# Altium schematic symbol library GyokuRe.SchLib: 1131 symbols (part 6 of 8)
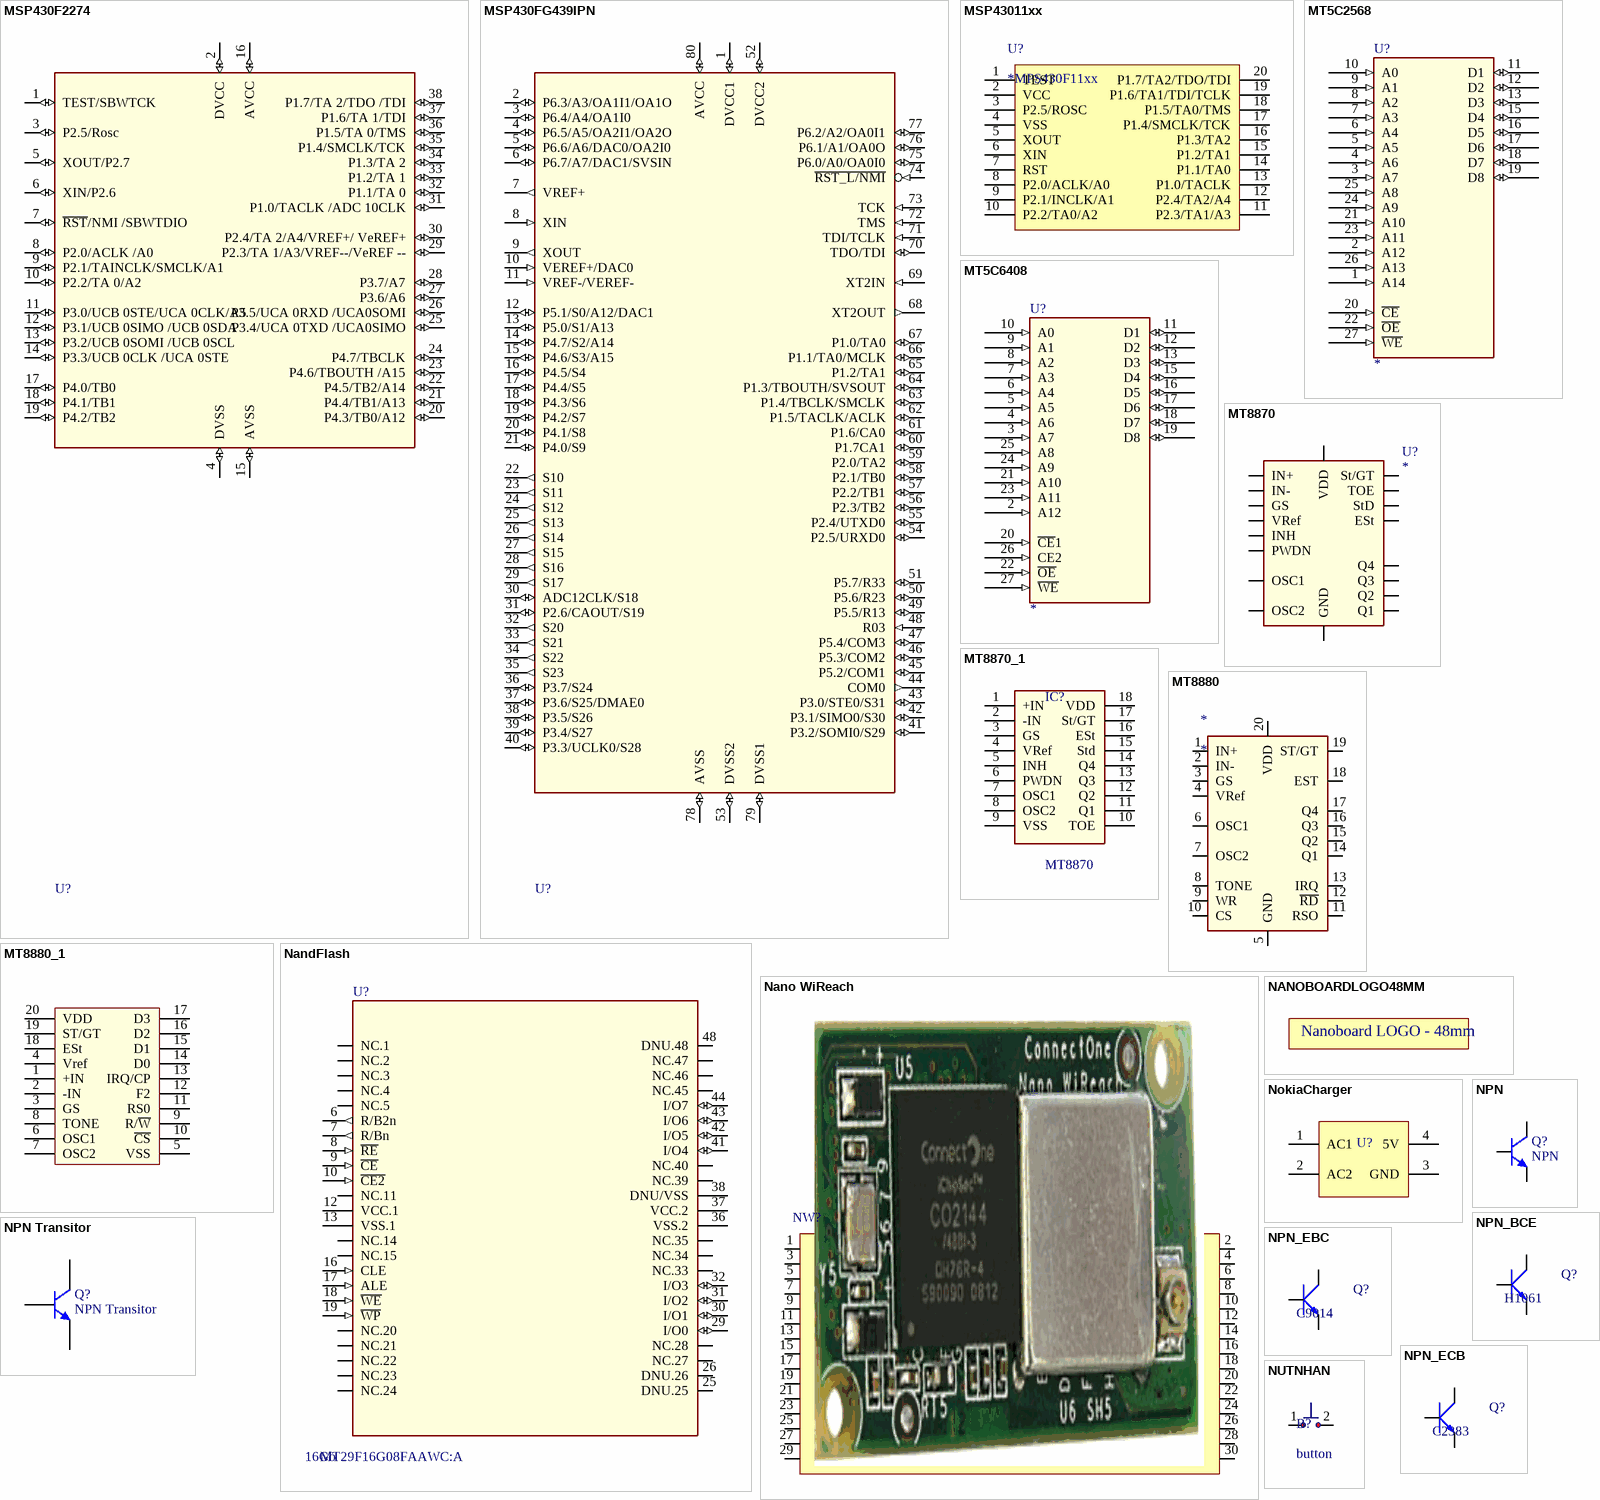
[diagram p54: symbols MSP430F2274 to NUTNHAN]

## MSP430FG439IPN
designator U?
16-bit MCU MSP430 family Texas Instrument; Flash: Kb; SRAM: Bytes; Volt: V; CPU Speed (MIPS): 0 MIPS; ComponentLink1Description: Degikey Part link; ComponentLink1URL: http://search.digikey.com/scripts/DkSearch/dksus.dll?Detail&name=296-17013-ND; ComponentLink2Description: Open DataSheet; ComponentLink2URL: H:\LIBRARY\LIBRARY.Datasheet\msp430fg437.pdf; Publisher: Hoang Nguyen; Manufacturer: Texas Instrument; Price: 13.24 [USD]
footprint QUAD80.MSP430FG439 (80-Pin Thin Quad Flat Pack 0.5 mm Pitch, IPC Low Density)
pins: 1 DVCC1 (io), 2 P6.3/A3/OA1I1/OA1O (io), 3 P6.4/A4/OA1I0 (io), 4 P6.5/A5/OA2I1/OA2O (io), 5 P6.6/A6/DAC0/OA2I0 (io), 6 P6.7/A7/DAC1/SVSIN (io), 7 VREF+ (out), 8 XIN (in), 9 XOUT (out), 10 VEREF+/DAC0 (in), 11 VREF-/VEREF- (in), 12 P5.1/S0/A12/DAC1 (io), 13 P5.0/S1/A13 (io), 14 P4.7/S2/A14 (io), 15 P4.6/S3/A15 (io), 16 P4.5/S4 (io), 17 P4.4/S5 (io), 18 P4.3/S6 (io), 19 P4.2/S7 (io), 20 P4.1/S8 (io), 21 P4.0/S9 (io), 22 S10 (out), 23 S11 (out), 24 S12 (out), 25 S13 (out), 26 S14 (out), 27 S15 (out), 28 S16 (out), 29 S17 (out), 30 ADC12CLK/S18 (io), 31 P2.6/CAOUT/S19 (io), 32 S20 (out), 33 S21 (out), 34 S22 (out), 35 S23 (out), 36 P3.7/S24 (io), 37 P3.6/S25/DMAE0 (io), 38 P3.5/S26 (io), 39 P3.4/S27 (io), 40 P3.3/UCLK0/S28 (io), 41 P3.2/SOMI0/S29 (io), 42 P3.1/SIMO0/S30 (io), 43 P3.0/STE0/S31 (io), 44 COM0 (out), 45 P5.2/COM1 (io), 46 P5.3/COM2 (io), 47 P5.4/COM3 (io), 48 R03 (in), 49 P5.5/R13 (io), 50 P5.6/R23 (io), 51 P5.7/R33 (io), 52 DVCC2 (io), 53 DVSS2 (io), 54 P2.5/URXD0 (io), 55 P2.4/UTXD0 (io), 56 P2.3/TB2 (io), 57 P2.2/TB1 (io), 58 P2.1/TB0 (io), 59 P2.0/TA2 (io), 60 P1.7CA1 (io), 61 P1.6/CA0 (io), 62 P1.5/TACLK/ACLK (io), 63 P1.4/TBCLK/SMCLK (io), 64 P1.3/TBOUTH/SVSOUT (io), 65 P1.2/TA1 (io), 66 P1.1/TA0/MCLK (io), 67 P1.0/TA0 (io), 68 XT2OUT (out), 69 XT2IN (in), 70 TDO/TDI (io), 71 TDI/TCLK (in), 72 TMS (in), 73 TCK (in), 74 ~{RST_L/NMI} (in), 75 P6.0/A0/OA0I0 (io), 76 P6.1/A1/OA0O (io), 77 P6.2/A2/OA0I1 (io), 78 AVSS (io), 79 DVSS1 (io), 80 AVCC (io)

## MSP43011xx
designator U?, comment *MPS430F11xx
pins: 1 TEST, 2 VCC, 3 P2.5/ROSC, 4 VSS, 5 XOUT, 6 XIN, 7 RST, 8 P2.0/ACLK/A0, 9 P2.1/INCLK/A1, 10 P2.2/TA0/A2, 11 P2.3/TA1/A3, 12 P2.4/TA2/A4, 13 P1.0/TACLK, 14 P1.1/TA0, 15 P1.2/TA1, 16 P1.3/TA2, 17 P1.4/SMCLK/TCK, 18 P1.5/TA0/TMS, 19 P1.6/TA1/TDI/TCLK, 20 P1.7/TA2/TDO/TDI

## MT5C2568
designator U?
Vendor: Digikey; Published: 13-April-2009; Publisher: Hoang Nguyen; ComponentLink1Description: Digikey Part Link; ComponentLink2Description: Open Datasheet; ComponentLink2URL: H:\LIBRARY\LIBRARY.Datasheet\
pins: 1 A14 (in), 2 A12 (in), 3 A7 (in), 4 A6 (in), 5 A5 (in), 6 A4 (in), 7 A3 (in), 8 A2 (in), 9 A1 (in), 10 A0 (in), 11 D1 (io), 12 D2 (io), 13 D3 (io), 14 VSS (power) hidden to VSS, 15 D4 (io), 16 D5 (io), 17 D6 (io), 18 D7 (io), 19 D8 (io), 20 ~{CE} (in), 21 A10 (in), 22 ~{OE} (in), 23 A11 (in), 24 A9 (in), 25 A8 (in), 26 A13 (in), 27 ~{WE} (in), 28 VCC (power) hidden to VCC

## MT5C6408
designator U?
Vendor: Digikey; Published: 13-April-2009; Publisher: Hoang Nguyen; ComponentLink1Description: Digikey Part Link; ComponentLink2Description: Open Datasheet; ComponentLink2URL: H:\LIBRARY\LIBRARY.Datasheet\
pins: 2 A12 (in), 3 A7 (in), 4 A6 (in), 5 A5 (in), 6 A4 (in), 7 A3 (in), 8 A2 (in), 9 A1 (in), 10 A0 (in), 11 D1 (io), 12 D2 (io), 13 D3 (io), 14 VSS (power) hidden to VSS, 15 D4 (io), 16 D5 (io), 17 D6 (io), 18 D7 (io), 19 D8 (io), 20 ~{CE}1 (in), 21 A10 (in), 22 ~{OE} (in), 23 A11 (in), 24 A9 (in), 25 A8 (in), 26 CE2 (in), 27 ~{WE} (in), 28 VCC (power) hidden to VCC

## MT8870
designator U?
Vendor: Digikey; Published: 13-April-2009; Publisher: Hoang Nguyen; ComponentLink1Description: Digikey Part Link; ComponentLink2Description: Open Datasheet; ComponentLink2URL: H:\LIBRARY\LIBRARY.Datasheet\
pins: ESt, GND, GS, IN+, IN-, INH, OSC1, OSC2, PWDN, Q1, Q2, Q3, Q4, St/GT, StD, TOE, VDD, VRef

## MT8870_1
designator IC?, comment MT8870
DTMF RECEIVER IC MT8870 TESTER; Value: MT8068
footprint DIP18/W0.3 (18 PIN, W 300mil, Pin to pin 100mil)
pins: 1 +IN, 2 -IN, 3 GS, 4 VRef, 5 INH, 6 PWDN, 7 OSC1, 8 OSC2, 9 VSS, 10 TOE, 11 Q1, 12 Q2, 13 Q3, 14 Q4, 15 Std, 16 ESt, 17 St/GT, 18 VDD

## MT8880
designator *
footprint DIP20
pins: 1 IN+, 2 IN-, 3 GS, 4 VRef, 5 GND, 6 OSC1, 7 OSC2, 8 TONE, 9 WR, 10 CS, 11 RSO, 12 ~{RD}, 13 IRQ, 14 Q1, 15 Q2, 16 Q3, 17 Q4, 18 EST, 19 ST/GT, 20 VDD

## MT8880_1
designator IC?, comment MT8880C
Integrated DTMF Transceiver; Value: DIP20; Value: MT8880C
footprint DIP20/W0.3 (DIP 20, 20 PIN, W 300mil, Pin to pin 100mil)
pins: 1 +IN, 2 -IN, 3 GS, 4 Vref, 5 VSS, 6 OSC1, 7 OSC2, 8 TONE, 9 R/~{W}, 10 ~{CS}, 11 RS0, 12 F2, 13 IRQ/CP, 14 D0, 15 D1, 16 D2, 17 D3, 18 ESt, 19 ST/GT, 20 VDD

## NandFlash
designator U?  value MT29F16G08FAAWC:A  Memory: 16Gb  (hidden comment: *)
Flash Mem Parallel 3.3V 16G-Bit 2G x 8 20ns 48-Pin TSOP-I; Manufacturer: Micron Technology; Cell Type: NAND; Boot Type: Not Required; Supply Current: 35mA; Vendor: Arrow; Publisher: Hoang Nguyen; ComponentLink1Description: Arrow Part Link; ComponentLink2Description: Open Datasheet; ComponentLink1URL: http://app.arrownac.com/aws/pg_webc/0,1086,,00.html?application=SEARCH&appid=nac&event=1020&docid=43001120S9265491N2596; ComponentLink2URL: H:\LIBRARY\LIBRARY.Datasheet\4gb_nand_m40a.pdf; Manufacturer P/N: MT29F16G08FAAWC:A; Access Time (Max): 20ns; Operating Supply Voltage (Typ): 3.3V; Price: $30.65; Package: TSOP-1 Surface Mount; Interface Type: Parallel
footprint SSOP48.Flash
pins: 1 NC.1, 2 NC.2, 3 NC.3, 4 NC.4, 5 NC.5, 6 R/B2n (out), 7 R/Bn (out), 8 ~{RE} (in), 9 ~{CE} (in), 10 ~{CE2} (in), 11 NC.11, 12 VCC.1 (power), 13 VSS.1 (power), 14 NC.14, 15 NC.15, 16 CLE (in), 17 ALE (in), 18 ~{WE} (in), 19 ~{WP} (in), 20 NC.20, 21 NC.21, 22 NC.22, 23 NC.23, 24 NC.24, 25 DNU.25, 26 DNU.26, 27 NC.27, 28 NC.28, 29 I/O0 (io), 30 I/O1 (io), 31 I/O2 (io), 32 I/O3 (io), 33 NC.33, 34 NC.34, 35 NC.35, 36 VSS.2 (power), 37 VCC.2 (power), 38 DNU/VSS (power), 39 NC.39, 40 NC.40, 41 I/O4 (io), 42 I/O5 (io), 43 I/O6 (io), 44 I/O7 (io), 45 NC.45, 46 NC.46, 47 NC.47, 48 DNU.48

## Nano WiReach
designator NW?  (value not drawn)
secure serial-to-  Wireless LAN device server module that also   acts as a bridge to connect serial devices to   802.11b/g Wireless LANs; Voltage - Maximum: 50V; Current - Maximum: 500mA; Vendor: Digikey; Publisher: Hoang Nguyen; Temperature Range - Operating: -40°C to +105°C; Termination Interface: Surface Mount; ComponentLink1Description: Digikey Part Link; Manufacturer: *; Published: 13-April-2009; ComponentLink2Description: Open Datasheet; ComponentLink2URL: H:\LIBRARY\LIBRARY.Datasheet\
footprint Nano WiReach (secure serial-to-  Wireless LAN device server module)
pins: 1, 2, 3, 4, 5, 6, 7, 8, 9, 10, 11, 12, 13, 14, 15, 16, 17, 18, 19, 20, 21, 22, 23, 24, 25, 26, 27, 28, 29, 30

## NANOBOARDLOGO48MM
designator ?  (graphical)
Altium Logo; Vendor: Digikey; Published: 5-Jan-2004; Publisher: Altium Limited; ComponentLink1Description: Digikey Part Link; ComponentLink2Description: Open Datasheet; ComponentLink2URL: H:\LIBRARY\LIBRARY.Datasheet\
footprint NanoBoard1_LOGO (NanoBoard Logo)
pcadlib NanoBoard1_LOGO (NanoBoard Logo)
text: Nanoboard LOGO - 48mm

## NokiaCharger
designator U?, comment 6V Nokia Charger  (value not drawn)
Creator: Bien Nguyen
footprint NokiaCharger
pins: 1 AC1, 2 AC2, 3 GND, 4 5V

## NPN
designator Q?
NPN General; Published: 8-Jun-2000; LatestRevisionDate: 15-Jan-2003; LatestRevisionNote: PCB Footprint 'BCY-W3/D4.7' replaced; DatasheetDocument: 1997; PackageDocument: Sep-1998; PackageReference: TO-92A; Publisher: Altium Limited; Code_JEDEC: TO-92A; ComponentLink1Description: Manufacturer Link; ComponentLink1URL: http://www.fairchildsemi.com/; ComponentLink2Description: Datasheet; ComponentLink2URL: http://www.fairchildsemi.com/ds/2N%2F2N3904.pdf
footprint TRAN-LOWPOWER (TO, Flat Index; 3 In-Line, Axial Leads; Body Dia. 4.5mm; Leads 0.51 x 0.48 mm (max))
pins: 1 E, 2 C, 3 B

## NPN Transitor
designator Q?
NPN General Purpose Amplifier; Published: 8-Jun-2000; LatestRevisionDate: 15-Jan-2003; LatestRevisionNote: PCB Footprint 'BCY-W3/D4.7' replaced; DatasheetDocument: 1997; PackageDocument: Sep-1998; PackageReference: TO-92A; Publisher: Altium Limited; Code_JEDEC: TO-92A; ComponentLink1Description: Manufacturer Link; ComponentLink1URL: http://www.fairchildsemi.com/; ComponentLink2Description: Datasheet; ComponentLink2URL: http://www.fairchildsemi.com/ds/2N%2F2N3904.pdf
footprint TO-92A (TO, Flat Index; 3 In-Line, Axial Leads; Body Dia. 4.5mm; Leads 0.51 x 0.48 mm (max); ECB Position); pin to pad 2>3 3>2
footprint TO-247 (TO-247; 3 Leads; Solder Pad 35mil)
footprint TO-3 (Oval Flange Mount with (2) Offset Leads; Pin Spacing 10.92 mm; Lead Dia. 1.06 mm (max))
footprint TO-220-3 (TO-220; 3 Leads; Solder Pad 35mil)
footprint TO-220-3-Heatsink (TO-220; Heatsink; 3 Leads; Solder Pad 35mil)
footprint TO-247-V (TO-247; Vertical; 3 Leads; Solder Pad 35mil)
pins: 1 E, 2 B, 3 C

## NPN_BCE
designator Q?, comment H1061
P 1W, BCE; Value: TIP41
footprint QTO-220 (TO-220 - 1-2-3)
pins: 1 B, 2 C, 3 E

## NPN_EBC
designator Q?, comment C9014
P 600mW, EBC; Value: C9014
footprint QTO-92 (TO-92)
pins: 1 E, 2 B, 3 C

## NPN_ECB
designator Q?, comment C2383
P 600mW, ECB; Value: C1815
footprint QTO-92 (TO-92)
pins: 1 E, 2 C, 3 B

## NUTNHAN
designator B?, comment button
pins: 1, 2

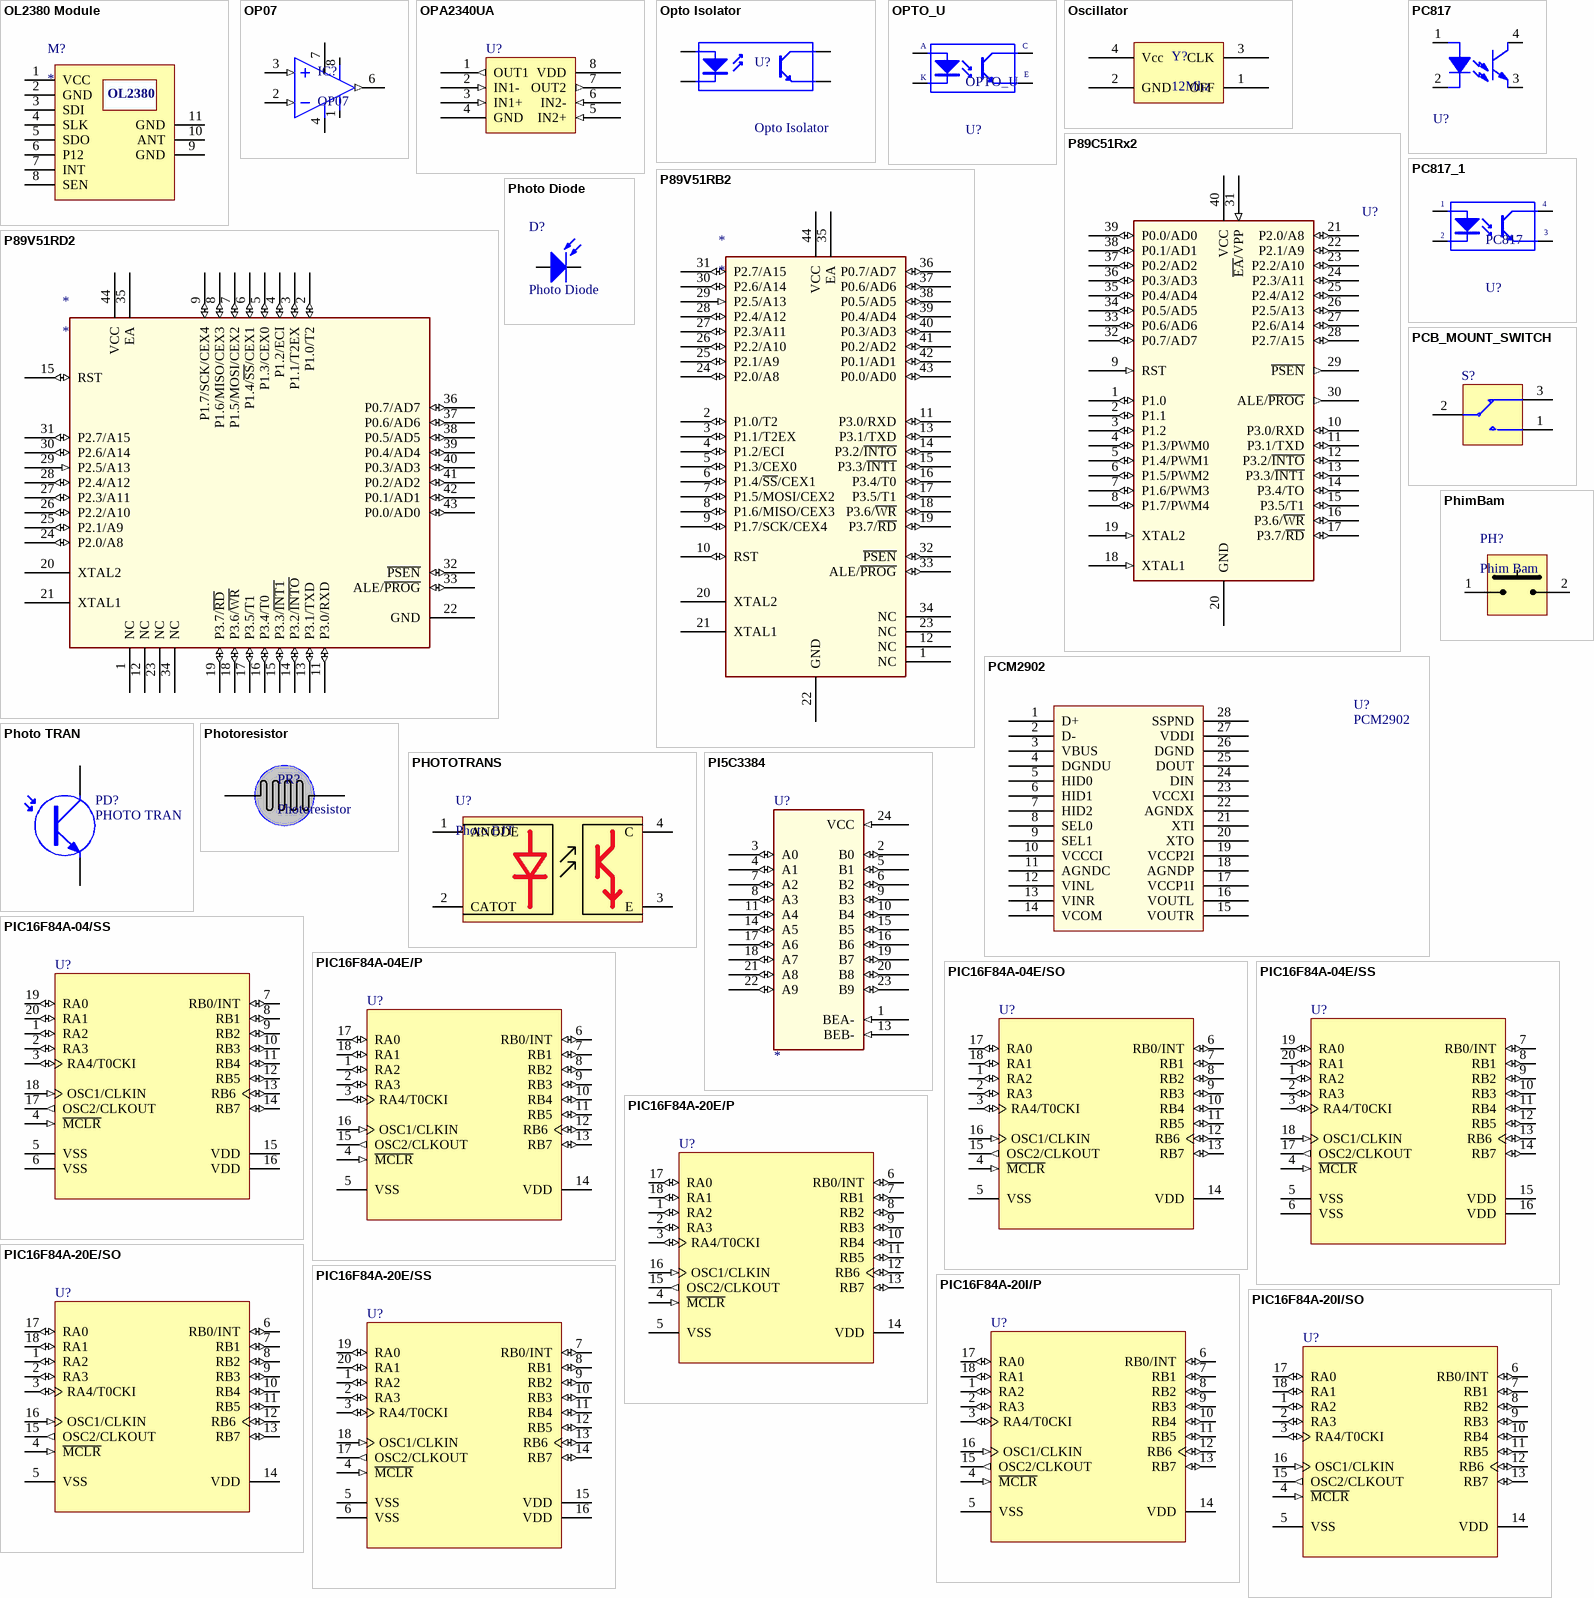
[diagram p32: symbols OL2380 Module to PIC16F84A-20I/SO]

## OL2380 Module
designator M?
NXP Radio module; Freq: *; Tx Power: *; Power Supply: *
footprint C1100 Module (TI Wireless Module)
footprint NXP RF Module (NXP Wireless Module)
pins: 1 VCC, 2 GND, 3 SDI, 4 SLK, 5 SDO, 6 P12, 7 INT, 8 SEN, 9 GND, 10 ANT, 11 GND
text: OL2380

## OP07
designator IC?
Single OA
footprint DIP8/W0.3 (8 PIN, W 300mil, Pin to pin 100mil)
pins: 1 Vos, 2 IN- (in), 3 IN+ (in), 4 -V, 6 OUT (out), 7 +V, 8 Vos

## OPA2340UA
designator U?
Dual Operational Amplifier, Single-Supply, Rail-to-Rail; Vendor: Digikey; Published: 5-Jan-2004; DatasheetDocument: 03-Oct-2003; Publisher: Altium Limited; ComponentLink1Description: Digikey Part Link; ComponentLink2Description: Open Datasheet; ComponentLink2URL: H:\LIBRARY\LIBRARY.Datasheet\
footprint SO-G8 (Small Outline; 8 Leads; Body Width 3.5 mm; Pitch 1.27 mm)
pcadlib SO-G8 (Small Outline; 8 Leads; Body Width 3.5 mm; Pitch 1.27 mm)
pins: 1 OUT1 (out), 2 IN1- (in), 3 IN1+ (in), 4 GND (power), 5 IN2+ (in), 6 IN2- (in), 7 OUT2 (out), 8 VDD (power)

## Opto Isolator
designator U?
4-Pin Phototransistor Optocoupler; Published: 24-Mar-1999; LatestRevisionDate: 04-Mar-2005; LatestRevisionNote: Sch pins 3 & 4 Swapped.; DatasheetDocument: Nov-2003; PackageReference: DIP-4; Publisher: Altium Limited
footprint PhotoCoupler (Opto quang)
pins: 1 A "Anode", 2 K "Cathode", 3 E "Emitter", 4 C "Collector"

## OPTO_U
designator U?
Single Opto; Value: TLP5211
footprint OPTO_U (Footprint not found)
pins: A "Anode", C "Collector", E "Emitter", K "Cathode"

## Oscillator
designator Y?, comment 12Mhz
Sealed Clock Crystal Oscillator
footprint OSC (Sealed Oscillator; Through-Hole; 4 Leads)
footprint OSC-SMD (Sealed Oscillator; SMD; 4 Leads)
pins: 1 OFF, 2 GND, 3 CLK, 4 Vcc

## P89C51Rx2
designator U?  (value not drawn)
Atmel MCU; Manufacturer: NXP; Flash: Kb; SRAM: Bytes; Volt: V; CPU Speed (MIPS): 0 MIPS; ComponentLink1Description: Degikey Part link; ComponentLink2Description: Open DataSheet; ComponentLink2URL: H:\LIBRARY\LIBRARY.Datasheet\; Publisher: Hoang Nguyen
footprint DIP600-40 (DIP, Plastic; 40 Leads; Row Spacing 15.24 mm; Pitch 2.54 mm)
footprint PLCC-44_M (Leaded Chip Carrier, 44-Leads, Body 16.6x16.6mm, Pitch 1.27mm, IPC Low Density)
footprint PLCC44
footprint PLCC44N
footprint PLCC44N_withIC
pins: 1 P1.0 (io), 2 P1.1 (io), 3 P1.2 (io), 4 P1.3/PWM0 (io), 5 P1.4/PWM1 (io), 6 P1.5/PWM2 (io), 7 P1.6/PWM3 (io), 8 P1.7/PWM4 (io), 9 RST (in), 10 P3.0/RXD (io), 11 P3.1/TXD (io), 12 P3.2/~{INTO} (io), 13 P3.3/~{INT1} (io), 14 P3.4/TO (io), 15 P3.5/T1 (io), 16 P3.6/~{WR} (io), 17 P3.7/~{RD} (io), 18 XTAL1 (in), 19 XTAL2 (in), 20 GND (power), 21 P2.0/A8 (io), 22 P2.1/A9 (io), 23 P2.2/A10 (io), 24 P2.3/A11 (io), 25 P2.4/A12 (io), 26 P2.5/A13 (io), 27 P2.6/A14 (io), 28 P2.7/A15 (io), 29 ~{PSEN} (out), 30 ALE/~{PROG} (out), 31 ~{EA}/VPP (in), 32 P0.7/AD7 (io), 33 P0.6/AD6 (io), 34 P0.5/AD5 (io), 35 P0.4/AD4 (io), 36 P0.3/AD3 (io), 37 P0.2/AD2 (io), 38 P0.1/AD1 (io), 39 P0.0/AD0 (io), 40 VCC (power)

## P89V51RB2
designator *
footprint PLCC44.89
footprint PLCC44N
pins: 1 NC, 2 P1.0/T2 (io), 3 P1.1/T2EX (io), 4 P1.2/ECI (io), 5 P1.3/CEX0 (io), 6 P1.4/~{SS}/CEX1 (io), 7 P1.5/MOSI/CEX2 (io), 8 P1.6/MISO/CEX3 (io), 9 P1.7/SCK/CEX4 (io), 10 RST (io), 11 P3.0/RXD (io), 12 NC, 13 P3.1/TXD (io), 14 P3.2/~{INTO} (io), 15 P3.3/~{INT1} (io), 16 P3.4/T0 (io), 17 P3.5/T1 (io), 18 P3.6/~{WR} (io), 19 P3.7/~{RD} (io), 20 XTAL2 (power), 21 XTAL1, 22 GND (power), 23 NC, 24 P2.0/A8 (io), 25 P2.1/A9 (io), 26 P2.2/A10 (io), 27 P2.3/A11 (io), 28 P2.4/A12 (io), 29 P2.5/A13 (in), 30 P2.6/A14 (io), 31 P2.7/A15 (io), 32 ~{PSEN} (io), 33 ALE/~{PROG} (io), 34 NC, 35 EA, 36 P0.7/AD7 (io), 37 P0.6/AD6 (io), 38 P0.5/AD5 (io), 39 P0.4/AD4 (io), 40 P0.3/AD3 (io), 41 P0.2/AD2 (io), 42 P0.1/AD1 (io), 43 P0.0/AD0 (io), 44 VCC

## P89V51RD2
designator *
footprint PLCC44N
pins: 1 NC, 2 P1.0/T2 (io), 3 P1.1/T2EX (io), 4 P1.2/ECI (io), 5 P1.3/CEX0 (io), 6 P1.4/~{SS}/CEX1 (io), 7 P1.5/MOSI/CEX2 (io), 8 P1.6/MISO/CEX3 (io), 9 P1.7/SCK/CEX4 (io), 11 P3.0/RXD (io), 12 NC, 13 P3.1/TXD (io), 14 P3.2/~{INTO} (io), 15 P3.3/~{INT1} (io), 15 RST (io), 16 P3.4/T0 (io), 17 P3.5/T1 (io), 18 P3.6/~{WR} (io), 19 P3.7/~{RD} (io), 20 XTAL2 (power), 21 XTAL1, 22 GND (power), 23 NC, 24 P2.0/A8 (io), 25 P2.1/A9 (io), 26 P2.2/A10 (io), 27 P2.3/A11 (io), 28 P2.4/A12 (io), 29 P2.5/A13 (in), 30 P2.6/A14 (io), 31 P2.7/A15 (io), 32 ~{PSEN} (io), 33 ALE/~{PROG} (io), 34 NC, 35 EA, 36 P0.7/AD7 (io), 37 P0.6/AD6 (io), 38 P0.5/AD5 (io), 39 P0.4/AD4 (io), 40 P0.3/AD3 (io), 41 P0.2/AD2 (io), 42 P0.1/AD1 (io), 43 P0.0/AD0 (io), 44 VCC

## PC817
designator U?  (value not drawn)
Opto Couple; Vendor: Digikey; Fc: 80Khz; Published: 13-April-2009; Publisher: Hoang Nguyen; ComponentLink1Description: Digikey Part Link; ComponentLink2Description: Open Datasheet; ComponentLink2URL: H:\LIBRARY\LIBRARY.Datasheet\ds_PC817.pdf
footprint DIP4
footprint DIP4N
pins: 1, 2, 3, 4

## PC817_1
designator U?, comment PC817
Single Opto; Value: PC817
footprint DIP4/W0.3 (4 PIN, W 300mil, Pin to pin 100mil)
pins: 1 A "Anode", 2 K "Cathode", 3 E "Emitter", 4 C "Collector"

## PCB_MOUNT_SWITCH
designator S?
SPDT Subminiature Toggle Switch, Right Angle Mounting, Vertical Actuation; Vendor: Digikey; Published: 5-Jan-2004; DatasheetDocument: 05-Dec-2000; Publisher: Altium Limited; ComponentLink1Description: Digikey Part Link; ComponentLink2Description: Open Datasheet; ComponentLink2URL: H:\LIBRARY\LIBRARY.Datasheet\
footprint TL36WW15050 (SPDT Subminiature Toggle Switch, Right Angle Mounting, Vertical Actuation)
pcadlib TL36WW15050 (SPDT Subminiature Toggle Switch, Right Angle Mounting, Vertical Actuation)
pins: 1, 2, 3